# Altium footprint library Connector.PcbLib: 86 footprints (part 2 of 6)
Each footprint in its own frame and in the unit in brackets; x right, y up, seen from the top. Pads: shape width x height; smd on the part's side, far side on the other; paste and mask are expansions set on the pad; w line width, h text height; cw(c..) or ccw(c..) is an arc to the next point about the centre after c.
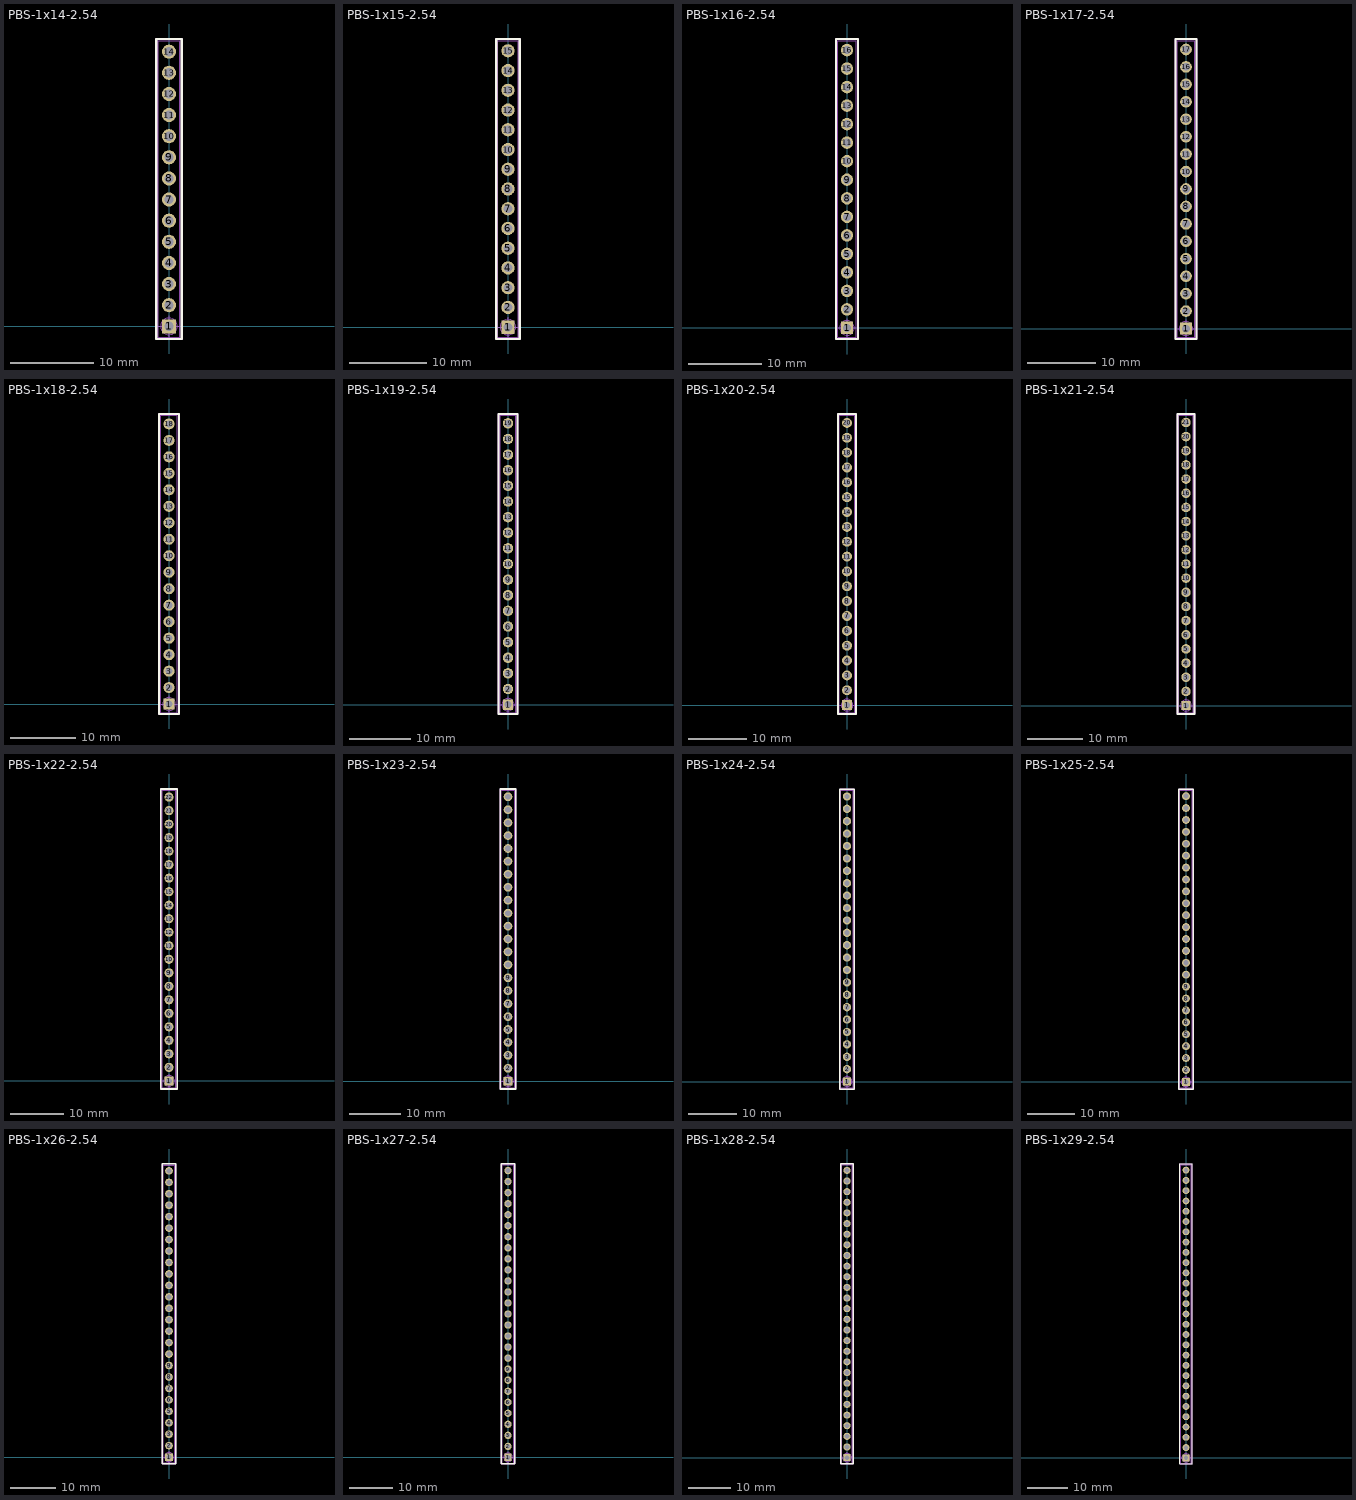
[diagram p1: the footprints below, top view; thin cyan lines are the x and y axes]

## PBS-1x14-2.54 [mm]
pads (14):
  rect 1.7x1.7 hole 1.1: 1(0,0)
  round 1.7 hole 1.1: 2(0,2.54) 3(0,5.08) 4(0,7.62) 5(0,10.16) 6(0,12.7) 7(0,15.24) 8(0,17.78) 9(0,20.32) 10(0,22.86) 11(0,25.4) 12(0,27.94) 13(0,30.48) 14(0,33.02)
Top Overlay:
  lines w0.3: -1.524,-1.524 1.524,-1.524 1.524,34.544 -1.524,34.544 -1.524,-1.524
Bottom Overlay:
  lines w0.3: -1.524,-1.524 1.524,-1.524 1.524,34.544 -1.524,34.544 -1.524,-1.524
Top Assembly:
  lines w0.1: -1.295,-1.295 1.295,-1.295 1.295,34.315 -1.295,34.315 -1.295,-1.295
Top Component Outline:
  lines w0.3: -1.524,-1.524 1.524,-1.524 1.524,34.544 -1.524,34.544 -1.524,-1.524
Top Component Center:
  circle w0.1: c0,0 r1
  lines w0.1: -1.25,0 1.25,0 ; 0,-1.25 0,1.25
3D body "PBS-1x1 2.54.stp": height 8.5, standoff -3.2, extent -1.245,-1.272 1.295,1.268
3D body "PBS-1x1 2.54.stp": height 8.5, standoff -3.2, extent -1.245,1.268 1.295,3.808
3D body "PBS-1x1 2.54.stp": height 8.5, standoff -3.2, extent -1.245,3.808 1.295,6.348
3D body "PBS-1x1 2.54.stp": height 8.5, standoff -3.2, extent -1.245,6.348 1.295,8.888
3D body "PBS-1x1 2.54.stp": height 8.5, standoff -3.2, extent -1.245,8.888 1.295,11.428
3D body "PBS-1x1 2.54.stp": height 8.5, standoff -3.2, extent -1.245,11.428 1.295,13.968
3D body "PBS-1x1 2.54.stp": height 8.5, standoff -3.2, extent -1.245,13.968 1.295,16.508
3D body "PBS-1x1 2.54.stp": height 8.5, standoff -3.2, extent -1.245,16.508 1.295,19.048
3D body "PBS-1x1 2.54.stp": height 8.5, standoff -3.2, extent -1.245,19.048 1.295,21.588
3D body "PBS-1x1 2.54.stp": height 8.5, standoff -3.2, extent -1.245,21.588 1.295,24.128
3D body "PBS-1x1 2.54.stp": height 8.5, standoff -3.2, extent -1.245,24.128 1.295,26.668
3D body "PBS-1x1 2.54.stp": height 8.5, standoff -3.2, extent -1.245,26.668 1.295,29.208
3D body "PBS-1x1 2.54.stp": height 8.5, standoff -3.2, extent -1.245,29.208 1.295,31.748
3D body "PBS-1x1 2.54.stp": height 8.5, standoff -3.2, extent -1.245,31.748 1.295,34.288

## PBS-1x15-2.54 [mm]
pads (15):
  rect 1.7x1.7 hole 1.1: 1(0,0)
  round 1.7 hole 1.1: 2(0,2.54) 3(0,5.08) 4(0,7.62) 5(0,10.16) 6(0,12.7) 7(0,15.24) 8(0,17.78) 9(0,20.32) 10(0,22.86) 11(0,25.4) 12(0,27.94) 13(0,30.48) 14(0,33.02) 15(0,35.56)
Top Overlay:
  lines w0.3: -1.524,-1.524 1.524,-1.524 1.524,37.084 -1.524,37.084 -1.524,-1.524
Bottom Overlay:
  lines w0.3: -1.524,-1.524 1.524,-1.524 1.524,37.084 -1.524,37.084 -1.524,-1.524
Top Assembly:
  lines w0.1: -1.295,-1.295 1.295,-1.295 1.295,36.855 -1.295,36.855 -1.295,-1.295
Top Component Outline:
  lines w0.3: -1.524,-1.524 1.524,-1.524 1.524,37.084 -1.524,37.084 -1.524,-1.524
Top Component Center:
  circle w0.1: c0,0 r1
  lines w0.1: -1.25,0 1.25,0 ; 0,-1.25 0,1.25
3D body "PBS-1x1 2.54.stp": height 8.5, standoff -3.2, extent -1.245,-1.272 1.295,1.268
3D body "PBS-1x1 2.54.stp": height 8.5, standoff -3.2, extent -1.245,1.268 1.295,3.808
3D body "PBS-1x1 2.54.stp": height 8.5, standoff -3.2, extent -1.245,3.808 1.295,6.348
3D body "PBS-1x1 2.54.stp": height 8.5, standoff -3.2, extent -1.245,6.348 1.295,8.888
3D body "PBS-1x1 2.54.stp": height 8.5, standoff -3.2, extent -1.245,8.888 1.295,11.428
3D body "PBS-1x1 2.54.stp": height 8.5, standoff -3.2, extent -1.245,11.428 1.295,13.968
3D body "PBS-1x1 2.54.stp": height 8.5, standoff -3.2, extent -1.245,13.968 1.295,16.508
3D body "PBS-1x1 2.54.stp": height 8.5, standoff -3.2, extent -1.245,16.508 1.295,19.048
3D body "PBS-1x1 2.54.stp": height 8.5, standoff -3.2, extent -1.245,19.048 1.295,21.588
3D body "PBS-1x1 2.54.stp": height 8.5, standoff -3.2, extent -1.245,21.588 1.295,24.128
3D body "PBS-1x1 2.54.stp": height 8.5, standoff -3.2, extent -1.245,24.128 1.295,26.668
3D body "PBS-1x1 2.54.stp": height 8.5, standoff -3.2, extent -1.245,26.668 1.295,29.208
3D body "PBS-1x1 2.54.stp": height 8.5, standoff -3.2, extent -1.245,29.208 1.295,31.748
3D body "PBS-1x1 2.54.stp": height 8.5, standoff -3.2, extent -1.245,31.748 1.295,34.288
3D body "PBS-1x1 2.54.stp": height 8.5, standoff -3.2, extent -1.245,34.288 1.295,36.828

## PBS-1x16-2.54 [mm]
pads (16):
  rect 1.7x1.7 hole 1.1: 1(0,0)
  round 1.7 hole 1.1: 2(0,2.54) 3(0,5.08) 4(0,7.62) 5(0,10.16) 6(0,12.7) 7(0,15.24) 8(0,17.78) 9(0,20.32) 10(0,22.86) 11(0,25.4) 12(0,27.94) 13(0,30.48) 14(0,33.02) 15(0,35.56) 16(0,38.1)
Top Overlay:
  lines w0.3: -1.524,-1.524 -1.524,39.624 1.524,39.624 1.524,-1.524 -1.524,-1.524
Bottom Overlay:
  lines w0.3: -1.524,-1.524 -1.524,39.624 1.524,39.624 1.524,-1.524 -1.524,-1.524
Top Assembly:
  lines w0.1: -1.295,-1.295 1.295,-1.295 1.295,39.395 -1.295,39.395 -1.295,-1.295
Top Component Outline:
  lines w0.3: -1.524,-1.524 -1.524,39.624 1.524,39.624 1.524,-1.524 -1.524,-1.524
Top Component Center:
  circle w0.1: c0,0 r1
  lines w0.1: -1.25,0 1.25,0 ; 0,-1.25 0,1.25
3D body "PBS-1x1 2.54.stp": height 8.5, standoff -3.2, extent -1.245,-1.272 1.295,1.268
3D body "PBS-1x1 2.54.stp": height 8.5, standoff -3.2, extent -1.245,1.268 1.295,3.808
3D body "PBS-1x1 2.54.stp": height 8.5, standoff -3.2, extent -1.245,3.808 1.295,6.348
3D body "PBS-1x1 2.54.stp": height 8.5, standoff -3.2, extent -1.245,6.348 1.295,8.888
3D body "PBS-1x1 2.54.stp": height 8.5, standoff -3.2, extent -1.245,8.888 1.295,11.428
3D body "PBS-1x1 2.54.stp": height 8.5, standoff -3.2, extent -1.245,11.428 1.295,13.968
3D body "PBS-1x1 2.54.stp": height 8.5, standoff -3.2, extent -1.245,13.968 1.295,16.508
3D body "PBS-1x1 2.54.stp": height 8.5, standoff -3.2, extent -1.245,16.508 1.295,19.048
3D body "PBS-1x1 2.54.stp": height 8.5, standoff -3.2, extent -1.245,19.048 1.295,21.588
3D body "PBS-1x1 2.54.stp": height 8.5, standoff -3.2, extent -1.245,21.588 1.295,24.128
3D body "PBS-1x1 2.54.stp": height 8.5, standoff -3.2, extent -1.245,24.128 1.295,26.668
3D body "PBS-1x1 2.54.stp": height 8.5, standoff -3.2, extent -1.245,26.668 1.295,29.208
3D body "PBS-1x1 2.54.stp": height 8.5, standoff -3.2, extent -1.245,29.208 1.295,31.748
3D body "PBS-1x1 2.54.stp": height 8.5, standoff -3.2, extent -1.245,31.748 1.295,34.288
3D body "PBS-1x1 2.54.stp": height 8.5, standoff -3.2, extent -1.245,34.288 1.295,36.828
3D body "PBS-1x1 2.54.stp": height 8.5, standoff -3.2, extent -1.245,36.828 1.295,39.368

## PBS-1x17-2.54 [mm]
pads (17):
  rect 1.7x1.7 hole 1.1: 1(0,0)
  round 1.7 hole 1.1: 2(0,2.54) 3(0,5.08) 4(0,7.62) 5(0,10.16) 6(0,12.7) 7(0,15.24) 8(0,17.78) 9(0,20.32) 10(0,22.86) 11(0,25.4) 12(0,27.94) 13(0,30.48) 14(0,33.02) 15(0,35.56) 16(0,38.1) 17(0,40.64)
Top Overlay:
  lines w0.3: -1.524,-1.524 -1.524,42.164 1.524,42.164 1.524,-1.524 -1.524,-1.524
Bottom Overlay:
  lines w0.3: -1.524,-1.524 -1.524,42.164 1.524,42.164 1.524,-1.524 -1.524,-1.524
Top Assembly:
  lines w0.1: -1.295,-1.295 1.295,-1.295 1.295,41.935 -1.295,41.935 -1.295,-1.295
Top Component Outline:
  lines w0.3: -1.524,-1.524 -1.524,42.164 1.524,42.164 1.524,-1.524 -1.524,-1.524
Top Component Center:
  circle w0.1: c0,0 r1
  lines w0.1: -1.25,0 1.25,0 ; 0,-1.25 0,1.25
3D body "PBS-1x1 2.54.stp": height 8.5, standoff -3.2, extent -1.245,39.368 1.295,41.908
3D body "PBS-1x1 2.54.stp": height 8.5, standoff -3.2, extent -1.245,36.828 1.295,39.368
3D body "PBS-1x1 2.54.stp": height 8.5, standoff -3.2, extent -1.245,34.288 1.295,36.828
3D body "PBS-1x1 2.54.stp": height 8.5, standoff -3.2, extent -1.245,31.748 1.295,34.288
3D body "PBS-1x1 2.54.stp": height 8.5, standoff -3.2, extent -1.245,29.208 1.295,31.748
3D body "PBS-1x1 2.54.stp": height 8.5, standoff -3.2, extent -1.245,26.668 1.295,29.208
3D body "PBS-1x1 2.54.stp": height 8.5, standoff -3.2, extent -1.245,24.128 1.295,26.668
3D body "PBS-1x1 2.54.stp": height 8.5, standoff -3.2, extent -1.245,21.588 1.295,24.128
3D body "PBS-1x1 2.54.stp": height 8.5, standoff -3.2, extent -1.245,19.048 1.295,21.588
3D body "PBS-1x1 2.54.stp": height 8.5, standoff -3.2, extent -1.245,16.508 1.295,19.048
3D body "PBS-1x1 2.54.stp": height 8.5, standoff -3.2, extent -1.245,13.968 1.295,16.508
3D body "PBS-1x1 2.54.stp": height 8.5, standoff -3.2, extent -1.245,11.428 1.295,13.968
3D body "PBS-1x1 2.54.stp": height 8.5, standoff -3.2, extent -1.245,8.888 1.295,11.428
3D body "PBS-1x1 2.54.stp": height 8.5, standoff -3.2, extent -1.245,6.348 1.295,8.888
3D body "PBS-1x1 2.54.stp": height 8.5, standoff -3.2, extent -1.245,3.808 1.295,6.348
3D body "PBS-1x1 2.54.stp": height 8.5, standoff -3.2, extent -1.245,1.268 1.295,3.808
3D body "PBS-1x1 2.54.stp": height 8.5, standoff -3.2, extent -1.245,-1.272 1.295,1.268

## PBS-1x18-2.54 [mm]
pads (18):
  rect 1.7x1.7 hole 1.1: 1(0,0)
  round 1.7 hole 1.1: 2(0,2.54) 3(0,5.08) 4(0,7.62) 5(0,10.16) 6(0,12.7) 7(0,15.24) 8(0,17.78) 9(0,20.32) 10(0,22.86) 11(0,25.4) 12(0,27.94) 13(0,30.48) 14(0,33.02) 15(0,35.56) 16(0,38.1) 17(0,40.64) 18(0,43.18)
Top Overlay:
  lines w0.3: -1.524,-1.524 -1.524,44.704 1.524,44.704 1.524,-1.524 -1.524,-1.524
Bottom Overlay:
  lines w0.3: -1.524,-1.524 -1.524,44.704 1.524,44.704 1.524,-1.524 -1.524,-1.524
Top Assembly:
  lines w0.1: -1.295,-1.295 -1.295,44.475 1.295,44.475 1.295,-1.295 -1.295,-1.295
Top Component Outline:
  lines w0.3: -1.524,-1.524 -1.524,44.704 1.524,44.704 1.524,-1.524 -1.524,-1.524
Top Component Center:
  circle w0.1: c0,0 r1
  lines w0.1: -1.25,0 1.25,0 ; 0,-1.25 0,1.25
3D body "PBS-1x1 2.54.stp": height 8.5, standoff -3.2, extent -1.245,41.908 1.295,44.448
3D body "PBS-1x1 2.54.stp": height 8.5, standoff -3.2, extent -1.245,39.368 1.295,41.908
3D body "PBS-1x1 2.54.stp": height 8.5, standoff -3.2, extent -1.245,36.828 1.295,39.368
3D body "PBS-1x1 2.54.stp": height 8.5, standoff -3.2, extent -1.245,34.288 1.295,36.828
3D body "PBS-1x1 2.54.stp": height 8.5, standoff -3.2, extent -1.245,31.748 1.295,34.288
3D body "PBS-1x1 2.54.stp": height 8.5, standoff -3.2, extent -1.245,29.208 1.295,31.748
3D body "PBS-1x1 2.54.stp": height 8.5, standoff -3.2, extent -1.245,26.668 1.295,29.208
3D body "PBS-1x1 2.54.stp": height 8.5, standoff -3.2, extent -1.245,24.128 1.295,26.668
3D body "PBS-1x1 2.54.stp": height 8.5, standoff -3.2, extent -1.245,21.588 1.295,24.128
3D body "PBS-1x1 2.54.stp": height 8.5, standoff -3.2, extent -1.245,19.048 1.295,21.588
3D body "PBS-1x1 2.54.stp": height 8.5, standoff -3.2, extent -1.245,16.508 1.295,19.048
3D body "PBS-1x1 2.54.stp": height 8.5, standoff -3.2, extent -1.245,13.968 1.295,16.508
3D body "PBS-1x1 2.54.stp": height 8.5, standoff -3.2, extent -1.245,11.428 1.295,13.968
3D body "PBS-1x1 2.54.stp": height 8.5, standoff -3.2, extent -1.245,8.888 1.295,11.428
3D body "PBS-1x1 2.54.stp": height 8.5, standoff -3.2, extent -1.245,6.348 1.295,8.888
3D body "PBS-1x1 2.54.stp": height 8.5, standoff -3.2, extent -1.245,3.808 1.295,6.348
3D body "PBS-1x1 2.54.stp": height 8.5, standoff -3.2, extent -1.245,1.268 1.295,3.808
3D body "PBS-1x1 2.54.stp": height 8.5, standoff -3.2, extent -1.245,-1.272 1.295,1.268

## PBS-1x19-2.54 [mm]
pads (19):
  rect 1.7x1.7 hole 1.1: 1(0,0)
  round 1.7 hole 1.1: 2(0,2.54) 3(0,5.08) 4(0,7.62) 5(0,10.16) 6(0,12.7) 7(0,15.24) 8(0,17.78) 9(0,20.32) 10(0,22.86) 11(0,25.4) 12(0,27.94) 13(0,30.48) 14(0,33.02) 15(0,35.56) 16(0,38.1) 17(0,40.64) 18(0,43.18) 19(0,45.72)
Top Overlay:
  lines w0.3: -1.524,-1.524 1.524,-1.524 1.524,47.244 -1.524,47.244 -1.524,-1.524
Bottom Overlay:
  lines w0.3: -1.524,-1.524 1.524,-1.524 1.524,47.244 -1.524,47.244 -1.524,-1.524
Top Assembly:
  lines w0.1: -1.295,-1.295 1.295,-1.295 1.295,47.015 -1.295,47.015 -1.295,-1.295
Top Component Outline:
  lines w0.3: -1.524,-1.524 1.524,-1.524 1.524,47.244 -1.524,47.244 -1.524,-1.524
Top Component Center:
  circle w0.1: c0,0 r1
  lines w0.1: -1.25,0 1.25,0 ; 0,-1.25 0,1.25
3D body "PBS-1x1 2.54.stp": height 8.5, standoff -3.2, extent -1.245,-1.272 1.295,1.268
3D body "PBS-1x1 2.54.stp": height 8.5, standoff -3.2, extent -1.245,1.268 1.295,3.808
3D body "PBS-1x1 2.54.stp": height 8.5, standoff -3.2, extent -1.245,3.808 1.295,6.348
3D body "PBS-1x1 2.54.stp": height 8.5, standoff -3.2, extent -1.245,6.348 1.295,8.888
3D body "PBS-1x1 2.54.stp": height 8.5, standoff -3.2, extent -1.245,8.888 1.295,11.428
3D body "PBS-1x1 2.54.stp": height 8.5, standoff -3.2, extent -1.245,11.428 1.295,13.968
3D body "PBS-1x1 2.54.stp": height 8.5, standoff -3.2, extent -1.245,13.968 1.295,16.508
3D body "PBS-1x1 2.54.stp": height 8.5, standoff -3.2, extent -1.245,16.508 1.295,19.048
3D body "PBS-1x1 2.54.stp": height 8.5, standoff -3.2, extent -1.245,19.048 1.295,21.588
3D body "PBS-1x1 2.54.stp": height 8.5, standoff -3.2, extent -1.245,21.588 1.295,24.128
3D body "PBS-1x1 2.54.stp": height 8.5, standoff -3.2, extent -1.245,24.128 1.295,26.668
3D body "PBS-1x1 2.54.stp": height 8.5, standoff -3.2, extent -1.245,26.668 1.295,29.208
3D body "PBS-1x1 2.54.stp": height 8.5, standoff -3.2, extent -1.245,29.208 1.295,31.748
3D body "PBS-1x1 2.54.stp": height 8.5, standoff -3.2, extent -1.245,31.748 1.295,34.288
3D body "PBS-1x1 2.54.stp": height 8.5, standoff -3.2, extent -1.245,34.288 1.295,36.828
3D body "PBS-1x1 2.54.stp": height 8.5, standoff -3.2, extent -1.245,36.828 1.295,39.368
3D body "PBS-1x1 2.54.stp": height 8.5, standoff -3.2, extent -1.245,39.368 1.295,41.908
3D body "PBS-1x1 2.54.stp": height 8.5, standoff -3.2, extent -1.245,41.908 1.295,44.448
3D body "PBS-1x1 2.54.stp": height 8.5, standoff -3.2, extent -1.245,44.448 1.295,46.988

## PBS-1x20-2.54 [mm]
pads (20):
  rect 1.7x1.7 hole 1.1: 1(0,0)
  round 1.7 hole 1.1: 2(0,2.54) 3(0,5.08) 4(0,7.62) 5(0,10.16) 6(0,12.7) 7(0,15.24) 8(0,17.78) 9(0,20.32) 10(0,22.86) 11(0,25.4) 12(0,27.94) 13(0,30.48) 14(0,33.02) 15(0,35.56) 16(0,38.1) 17(0,40.64) 18(0,43.18) 19(0,45.72) 20(0,48.26)
Top Overlay:
  lines w0.3: -1.524,-1.524 1.524,-1.524 1.524,49.784 -1.524,49.784 -1.524,-1.524
Bottom Overlay:
  lines w0.3: -1.524,-1.524 1.524,-1.524 1.524,49.784 -1.524,49.784 -1.524,-1.524
Top Assembly:
  lines w0.1: -1.295,-1.295 -1.295,49.555 1.295,49.555 1.295,-1.295 -1.295,-1.295
Top Component Outline:
  lines w0.3: -1.524,-1.524 1.524,-1.524 1.524,49.784 -1.524,49.784 -1.524,-1.524
Top Component Center:
  circle w0.1: c0,0 r1
  lines w0.1: -1.25,0 1.25,0 ; 0,-1.25 0,1.25
3D body "PBS-1x1 2.54.stp": height 8.5, standoff -3.2, extent -1.245,-1.272 1.295,1.268
3D body "PBS-1x1 2.54.stp": height 8.5, standoff -3.2, extent -1.245,1.268 1.295,3.808
3D body "PBS-1x1 2.54.stp": height 8.5, standoff -3.2, extent -1.245,3.808 1.295,6.348
3D body "PBS-1x1 2.54.stp": height 8.5, standoff -3.2, extent -1.245,6.348 1.295,8.888
3D body "PBS-1x1 2.54.stp": height 8.5, standoff -3.2, extent -1.245,8.888 1.295,11.428
3D body "PBS-1x1 2.54.stp": height 8.5, standoff -3.2, extent -1.245,11.428 1.295,13.968
3D body "PBS-1x1 2.54.stp": height 8.5, standoff -3.2, extent -1.245,13.968 1.295,16.508
3D body "PBS-1x1 2.54.stp": height 8.5, standoff -3.2, extent -1.245,16.508 1.295,19.048
3D body "PBS-1x1 2.54.stp": height 8.5, standoff -3.2, extent -1.245,19.048 1.295,21.588
3D body "PBS-1x1 2.54.stp": height 8.5, standoff -3.2, extent -1.245,21.588 1.295,24.128
3D body "PBS-1x1 2.54.stp": height 8.5, standoff -3.2, extent -1.245,24.128 1.295,26.668
3D body "PBS-1x1 2.54.stp": height 8.5, standoff -3.2, extent -1.245,26.668 1.295,29.208
3D body "PBS-1x1 2.54.stp": height 8.5, standoff -3.2, extent -1.245,29.208 1.295,31.748
3D body "PBS-1x1 2.54.stp": height 8.5, standoff -3.2, extent -1.245,31.748 1.295,34.288
3D body "PBS-1x1 2.54.stp": height 8.5, standoff -3.2, extent -1.245,34.288 1.295,36.828
3D body "PBS-1x1 2.54.stp": height 8.5, standoff -3.2, extent -1.245,36.828 1.295,39.368
3D body "PBS-1x1 2.54.stp": height 8.5, standoff -3.2, extent -1.245,39.368 1.295,41.908
3D body "PBS-1x1 2.54.stp": height 8.5, standoff -3.2, extent -1.245,41.908 1.295,44.448
3D body "PBS-1x1 2.54.stp": height 8.5, standoff -3.2, extent -1.245,44.448 1.295,46.988
3D body "PBS-1x1 2.54.stp": height 8.5, standoff -3.2, extent -1.245,46.988 1.295,49.528

## PBS-1x21-2.54 [mm]
pads (21):
  rect 1.7x1.7 hole 1.1: 1(0,0)
  round 1.7 hole 1.1: 2(0,2.54) 3(0,5.08) 4(0,7.62) 5(0,10.16) 6(0,12.7) 7(0,15.24) 8(0,17.78) 9(0,20.32) 10(0,22.86) 11(0,25.4) 12(0,27.94) 13(0,30.48) 14(0,33.02) 15(0,35.56) 16(0,38.1) 17(0,40.64) 18(0,43.18) 19(0,45.72) 20(0,48.26) 21(0,50.8)
Top Overlay:
  lines w0.3: -1.524,-1.524 -1.524,52.324 1.524,52.324 1.524,-1.524 -1.524,-1.524
Bottom Overlay:
  lines w0.3: -1.524,-1.524 -1.524,52.324 1.524,52.324 1.524,-1.524 -1.524,-1.524
Top Assembly:
  lines w0.1: -1.295,-1.295 -1.295,52.095 1.295,52.095 1.295,-1.295 -1.295,-1.295
Top Component Outline:
  lines w0.3: -1.524,-1.524 -1.524,52.324 1.524,52.324 1.524,-1.524 -1.524,-1.524
Top Component Center:
  circle w0.1: c0,0 r1
  lines w0.1: -1.25,0 1.25,0 ; 0,-1.25 0,1.25
3D body "PBS-1x1 2.54.stp": height 8.5, standoff -3.2, extent -1.245,-1.272 1.295,1.268
3D body "PBS-1x1 2.54.stp": height 8.5, standoff -3.2, extent -1.245,1.268 1.295,3.808
3D body "PBS-1x1 2.54.stp": height 8.5, standoff -3.2, extent -1.245,3.808 1.295,6.348
3D body "PBS-1x1 2.54.stp": height 8.5, standoff -3.2, extent -1.245,6.348 1.295,8.888
3D body "PBS-1x1 2.54.stp": height 8.5, standoff -3.2, extent -1.245,8.888 1.295,11.428
3D body "PBS-1x1 2.54.stp": height 8.5, standoff -3.2, extent -1.245,11.428 1.295,13.968
3D body "PBS-1x1 2.54.stp": height 8.5, standoff -3.2, extent -1.245,13.968 1.295,16.508
3D body "PBS-1x1 2.54.stp": height 8.5, standoff -3.2, extent -1.245,16.508 1.295,19.048
3D body "PBS-1x1 2.54.stp": height 8.5, standoff -3.2, extent -1.245,19.048 1.295,21.588
3D body "PBS-1x1 2.54.stp": height 8.5, standoff -3.2, extent -1.245,21.588 1.295,24.128
3D body "PBS-1x1 2.54.stp": height 8.5, standoff -3.2, extent -1.245,24.128 1.295,26.668
3D body "PBS-1x1 2.54.stp": height 8.5, standoff -3.2, extent -1.245,26.668 1.295,29.208
3D body "PBS-1x1 2.54.stp": height 8.5, standoff -3.2, extent -1.245,29.208 1.295,31.748
3D body "PBS-1x1 2.54.stp": height 8.5, standoff -3.2, extent -1.245,31.748 1.295,34.288
3D body "PBS-1x1 2.54.stp": height 8.5, standoff -3.2, extent -1.245,34.288 1.295,36.828
3D body "PBS-1x1 2.54.stp": height 8.5, standoff -3.2, extent -1.245,36.828 1.295,39.368
3D body "PBS-1x1 2.54.stp": height 8.5, standoff -3.2, extent -1.245,39.368 1.295,41.908
3D body "PBS-1x1 2.54.stp": height 8.5, standoff -3.2, extent -1.245,41.908 1.295,44.448
3D body "PBS-1x1 2.54.stp": height 8.5, standoff -3.2, extent -1.245,44.448 1.295,46.988
3D body "PBS-1x1 2.54.stp": height 8.5, standoff -3.2, extent -1.245,46.988 1.295,49.528
3D body "PBS-1x1 2.54.stp": height 8.5, standoff -3.2, extent -1.245,49.528 1.295,52.068

## PBS-1x22-2.54 [mm]
pads (22):
  rect 1.7x1.7 hole 1.1: 1(0,0)
  round 1.7 hole 1.1: 2(0,2.54) 3(0,5.08) 4(0,7.62) 5(0,10.16) 6(0,12.7) 7(0,15.24) 8(0,17.78) 9(0,20.32) 10(0,22.86) 11(0,25.4) 12(0,27.94) 13(0,30.48) 14(0,33.02) 15(0,35.56) 16(0,38.1) 17(0,40.64) 18(0,43.18) 19(0,45.72) 20(0,48.26) 21(0,50.8) 22(0,53.34)
Top Overlay:
  lines w0.3: -1.524,-1.524 1.524,-1.524 1.524,54.864 -1.524,54.864 -1.524,-1.524
Bottom Overlay:
  lines w0.3: -1.524,-1.524 1.524,-1.524 1.524,54.864 -1.524,54.864 -1.524,-1.524
Top Assembly:
  lines w0.1: -1.295,-1.295 -1.295,54.635 1.295,54.635 1.295,-1.295 -1.295,-1.295
Top Component Outline:
  lines w0.3: -1.524,-1.524 1.524,-1.524 1.524,54.864 -1.524,54.864 -1.524,-1.524
Top Component Center:
  circle w0.1: c0,0 r1
  lines w0.1: -1.25,0 1.25,0 ; 0,-1.25 0,1.25
3D body "PBS-1x1 2.54.stp": height 8.5, standoff -3.2, extent -1.245,-1.272 1.295,1.268
3D body "PBS-1x1 2.54.stp": height 8.5, standoff -3.2, extent -1.245,1.268 1.295,3.808
3D body "PBS-1x1 2.54.stp": height 8.5, standoff -3.2, extent -1.245,3.808 1.295,6.348
3D body "PBS-1x1 2.54.stp": height 8.5, standoff -3.2, extent -1.245,6.348 1.295,8.888
3D body "PBS-1x1 2.54.stp": height 8.5, standoff -3.2, extent -1.245,8.888 1.295,11.428
3D body "PBS-1x1 2.54.stp": height 8.5, standoff -3.2, extent -1.245,11.428 1.295,13.968
3D body "PBS-1x1 2.54.stp": height 8.5, standoff -3.2, extent -1.245,13.968 1.295,16.508
3D body "PBS-1x1 2.54.stp": height 8.5, standoff -3.2, extent -1.245,16.508 1.295,19.048
3D body "PBS-1x1 2.54.stp": height 8.5, standoff -3.2, extent -1.245,19.048 1.295,21.588
3D body "PBS-1x1 2.54.stp": height 8.5, standoff -3.2, extent -1.245,21.588 1.295,24.128
3D body "PBS-1x1 2.54.stp": height 8.5, standoff -3.2, extent -1.245,24.128 1.295,26.668
3D body "PBS-1x1 2.54.stp": height 8.5, standoff -3.2, extent -1.245,26.668 1.295,29.208
3D body "PBS-1x1 2.54.stp": height 8.5, standoff -3.2, extent -1.245,29.208 1.295,31.748
3D body "PBS-1x1 2.54.stp": height 8.5, standoff -3.2, extent -1.245,31.748 1.295,34.288
3D body "PBS-1x1 2.54.stp": height 8.5, standoff -3.2, extent -1.245,34.288 1.295,36.828
3D body "PBS-1x1 2.54.stp": height 8.5, standoff -3.2, extent -1.245,36.828 1.295,39.368
3D body "PBS-1x1 2.54.stp": height 8.5, standoff -3.2, extent -1.245,39.368 1.295,41.908
3D body "PBS-1x1 2.54.stp": height 8.5, standoff -3.2, extent -1.245,41.908 1.295,44.448
3D body "PBS-1x1 2.54.stp": height 8.5, standoff -3.2, extent -1.245,44.448 1.295,46.988
3D body "PBS-1x1 2.54.stp": height 8.5, standoff -3.2, extent -1.245,46.988 1.295,49.528
3D body "PBS-1x1 2.54.stp": height 8.5, standoff -3.2, extent -1.245,49.528 1.295,52.068
3D body "PBS-1x1 2.54.stp": height 8.5, standoff -3.2, extent -1.245,52.068 1.295,54.608

## PBS-1x23-2.54 [mm]
pads (23):
  rect 1.7x1.7 hole 1.1: 1(0,0)
  round 1.7 hole 1.1: 2(0,2.54) 3(0,5.08) 4(0,7.62) 5(0,10.16) 6(0,12.7) 7(0,15.24) 8(0,17.78) 9(0,20.32) 10(0,22.86) 11(0,25.4) 12(0,27.94) 13(0,30.48) 14(0,33.02) 15(0,35.56) 16(0,38.1) 17(0,40.64) 18(0,43.18) 19(0,45.72) 20(0,48.26) 21(0,50.8) 22(0,53.34) 23(0,55.88)
Top Overlay:
  lines w0.3: -1.524,-1.524 1.524,-1.524 1.524,57.404 -1.524,57.404 -1.524,-1.524
Bottom Overlay:
  lines w0.3: -1.524,-1.524 1.524,-1.524 1.524,57.404 -1.524,57.404 -1.524,-1.524
Top Assembly:
  lines w0.1: -1.295,-1.295 -1.295,57.175 1.295,57.175 1.295,-1.295 -1.295,-1.295
Top Component Outline:
  lines w0.3: -1.524,-1.524 1.524,-1.524 1.524,57.404 -1.524,57.404 -1.524,-1.524
Top Component Center:
  circle w0.1: c0,0 r1
  lines w0.1: -1.25,0 1.25,0 ; 0,-1.25 0,1.25
3D body "PBS-1x1 2.54.stp": height 8.5, standoff -3.2, extent -1.245,54.608 1.295,57.148
3D body "PBS-1x1 2.54.stp": height 8.5, standoff -3.2, extent -1.245,52.068 1.295,54.608
3D body "PBS-1x1 2.54.stp": height 8.5, standoff -3.2, extent -1.245,49.528 1.295,52.068
3D body "PBS-1x1 2.54.stp": height 8.5, standoff -3.2, extent -1.245,46.988 1.295,49.528
3D body "PBS-1x1 2.54.stp": height 8.5, standoff -3.2, extent -1.245,44.448 1.295,46.988
3D body "PBS-1x1 2.54.stp": height 8.5, standoff -3.2, extent -1.245,41.908 1.295,44.448
3D body "PBS-1x1 2.54.stp": height 8.5, standoff -3.2, extent -1.245,39.368 1.295,41.908
3D body "PBS-1x1 2.54.stp": height 8.5, standoff -3.2, extent -1.245,36.828 1.295,39.368
3D body "PBS-1x1 2.54.stp": height 8.5, standoff -3.2, extent -1.245,34.288 1.295,36.828
3D body "PBS-1x1 2.54.stp": height 8.5, standoff -3.2, extent -1.245,31.748 1.295,34.288
3D body "PBS-1x1 2.54.stp": height 8.5, standoff -3.2, extent -1.245,29.208 1.295,31.748
3D body "PBS-1x1 2.54.stp": height 8.5, standoff -3.2, extent -1.245,26.668 1.295,29.208
3D body "PBS-1x1 2.54.stp": height 8.5, standoff -3.2, extent -1.245,24.128 1.295,26.668
3D body "PBS-1x1 2.54.stp": height 8.5, standoff -3.2, extent -1.245,21.588 1.295,24.128
3D body "PBS-1x1 2.54.stp": height 8.5, standoff -3.2, extent -1.245,19.048 1.295,21.588
3D body "PBS-1x1 2.54.stp": height 8.5, standoff -3.2, extent -1.245,16.508 1.295,19.048
3D body "PBS-1x1 2.54.stp": height 8.5, standoff -3.2, extent -1.245,13.968 1.295,16.508
3D body "PBS-1x1 2.54.stp": height 8.5, standoff -3.2, extent -1.245,11.428 1.295,13.968
3D body "PBS-1x1 2.54.stp": height 8.5, standoff -3.2, extent -1.245,8.888 1.295,11.428
3D body "PBS-1x1 2.54.stp": height 8.5, standoff -3.2, extent -1.245,6.348 1.295,8.888
3D body "PBS-1x1 2.54.stp": height 8.5, standoff -3.2, extent -1.245,3.808 1.295,6.348
3D body "PBS-1x1 2.54.stp": height 8.5, standoff -3.2, extent -1.245,1.268 1.295,3.808
3D body "PBS-1x1 2.54.stp": height 8.5, standoff -3.2, extent -1.245,-1.272 1.295,1.268

## PBS-1x24-2.54 [mm]
pads (24):
  rect 1.7x1.7 hole 1.1: 1(0,0)
  round 1.7 hole 1.1: 2(0,2.54) 3(0,5.08) 4(0,7.62) 5(0,10.16) 6(0,12.7) 7(0,15.24) 8(0,17.78) 9(0,20.32) 10(0,22.86) 11(0,25.4) 12(0,27.94) 13(0,30.48) 14(0,33.02) 15(0,35.56) 16(0,38.1) 17(0,40.64) 18(0,43.18) 19(0,45.72) 20(0,48.26) 21(0,50.8) 22(0,53.34) 23(0,55.88) 24(0,58.42)
Top Overlay:
  lines w0.3: -1.524,-1.524 -1.524,59.944 1.524,59.944 1.524,-1.524 -1.524,-1.524
Bottom Overlay:
  lines w0.3: -1.524,-1.524 -1.524,59.944 1.524,59.944 1.524,-1.524 -1.524,-1.524
Top Assembly:
  lines w0.1: -1.295,-1.295 -1.295,59.715 1.295,59.715 1.295,-1.295 -1.295,-1.295
Top Component Outline:
  lines w0.3: -1.524,-1.524 -1.524,59.944 1.524,59.944 1.524,-1.524 -1.524,-1.524
Top Component Center:
  circle w0.1: c0,0 r1
  lines w0.1: -1.25,0 1.25,0 ; 0,-1.25 0,1.25
3D body "PBS-1x1 2.54.stp": height 8.5, standoff -3.2, extent -1.245,57.148 1.295,59.688
3D body "PBS-1x1 2.54.stp": height 8.5, standoff -3.2, extent -1.245,54.608 1.295,57.148
3D body "PBS-1x1 2.54.stp": height 8.5, standoff -3.2, extent -1.245,52.068 1.295,54.608
3D body "PBS-1x1 2.54.stp": height 8.5, standoff -3.2, extent -1.245,49.528 1.295,52.068
3D body "PBS-1x1 2.54.stp": height 8.5, standoff -3.2, extent -1.245,46.988 1.295,49.528
3D body "PBS-1x1 2.54.stp": height 8.5, standoff -3.2, extent -1.245,44.448 1.295,46.988
3D body "PBS-1x1 2.54.stp": height 8.5, standoff -3.2, extent -1.245,41.908 1.295,44.448
3D body "PBS-1x1 2.54.stp": height 8.5, standoff -3.2, extent -1.245,39.368 1.295,41.908
3D body "PBS-1x1 2.54.stp": height 8.5, standoff -3.2, extent -1.245,36.828 1.295,39.368
3D body "PBS-1x1 2.54.stp": height 8.5, standoff -3.2, extent -1.245,34.288 1.295,36.828
3D body "PBS-1x1 2.54.stp": height 8.5, standoff -3.2, extent -1.245,31.748 1.295,34.288
3D body "PBS-1x1 2.54.stp": height 8.5, standoff -3.2, extent -1.245,29.208 1.295,31.748
3D body "PBS-1x1 2.54.stp": height 8.5, standoff -3.2, extent -1.245,26.668 1.295,29.208
3D body "PBS-1x1 2.54.stp": height 8.5, standoff -3.2, extent -1.245,24.128 1.295,26.668
3D body "PBS-1x1 2.54.stp": height 8.5, standoff -3.2, extent -1.245,21.588 1.295,24.128
3D body "PBS-1x1 2.54.stp": height 8.5, standoff -3.2, extent -1.245,19.048 1.295,21.588
3D body "PBS-1x1 2.54.stp": height 8.5, standoff -3.2, extent -1.245,16.508 1.295,19.048
3D body "PBS-1x1 2.54.stp": height 8.5, standoff -3.2, extent -1.245,13.968 1.295,16.508
3D body "PBS-1x1 2.54.stp": height 8.5, standoff -3.2, extent -1.245,11.428 1.295,13.968
3D body "PBS-1x1 2.54.stp": height 8.5, standoff -3.2, extent -1.245,8.888 1.295,11.428
3D body "PBS-1x1 2.54.stp": height 8.5, standoff -3.2, extent -1.245,6.348 1.295,8.888
3D body "PBS-1x1 2.54.stp": height 8.5, standoff -3.2, extent -1.245,3.808 1.295,6.348
3D body "PBS-1x1 2.54.stp": height 8.5, standoff -3.2, extent -1.245,1.268 1.295,3.808
3D body "PBS-1x1 2.54.stp": height 8.5, standoff -3.2, extent -1.245,-1.272 1.295,1.268

## PBS-1x25-2.54 [mm]
pads (25):
  rect 1.7x1.7 hole 1.1: 1(0,0)
  round 1.7 hole 1.1: 2(0,2.54) 3(0,5.08) 4(0,7.62) 5(0,10.16) 6(0,12.7) 7(0,15.24) 8(0,17.78) 9(0,20.32) 10(0,22.86) 11(0,25.4) 12(0,27.94) 13(0,30.48) 14(0,33.02) 15(0,35.56) 16(0,38.1) 17(0,40.64) 18(0,43.18) 19(0,45.72) 20(0,48.26) 21(0,50.8) 22(0,53.34) 23(0,55.88) 24(0,58.42) 25(0,60.96)
Top Overlay:
  lines w0.3: -1.524,-1.524 1.524,-1.524 1.524,62.484 -1.524,62.484 -1.524,-1.524
Bottom Overlay:
  lines w0.3: -1.524,-1.524 1.524,-1.524 1.524,62.484 -1.524,62.484 -1.524,-1.524
Top Assembly:
  lines w0.1: -1.295,-1.295 -1.295,62.255 1.295,62.255 1.295,-1.295 -1.295,-1.295
Top Component Outline:
  lines w0.3: -1.524,-1.524 1.524,-1.524 1.524,62.484 -1.524,62.484 -1.524,-1.524
Top Component Center:
  circle w0.1: c0,0 r1
  lines w0.1: -1.25,0 1.25,0 ; 0,-1.25 0,1.25
3D body "PBS-1x1 2.54.stp": height 8.5, standoff -3.2, extent -1.245,59.688 1.295,62.228
3D body "PBS-1x1 2.54.stp": height 8.5, standoff -3.2, extent -1.245,57.148 1.295,59.688
3D body "PBS-1x1 2.54.stp": height 8.5, standoff -3.2, extent -1.245,54.608 1.295,57.148
3D body "PBS-1x1 2.54.stp": height 8.5, standoff -3.2, extent -1.245,52.068 1.295,54.608
3D body "PBS-1x1 2.54.stp": height 8.5, standoff -3.2, extent -1.245,49.528 1.295,52.068
3D body "PBS-1x1 2.54.stp": height 8.5, standoff -3.2, extent -1.245,46.988 1.295,49.528
3D body "PBS-1x1 2.54.stp": height 8.5, standoff -3.2, extent -1.245,44.448 1.295,46.988
3D body "PBS-1x1 2.54.stp": height 8.5, standoff -3.2, extent -1.245,41.908 1.295,44.448
3D body "PBS-1x1 2.54.stp": height 8.5, standoff -3.2, extent -1.245,39.368 1.295,41.908
3D body "PBS-1x1 2.54.stp": height 8.5, standoff -3.2, extent -1.245,36.828 1.295,39.368
3D body "PBS-1x1 2.54.stp": height 8.5, standoff -3.2, extent -1.245,34.288 1.295,36.828
3D body "PBS-1x1 2.54.stp": height 8.5, standoff -3.2, extent -1.245,31.748 1.295,34.288
3D body "PBS-1x1 2.54.stp": height 8.5, standoff -3.2, extent -1.245,29.208 1.295,31.748
3D body "PBS-1x1 2.54.stp": height 8.5, standoff -3.2, extent -1.245,26.668 1.295,29.208
3D body "PBS-1x1 2.54.stp": height 8.5, standoff -3.2, extent -1.245,24.128 1.295,26.668
3D body "PBS-1x1 2.54.stp": height 8.5, standoff -3.2, extent -1.245,21.588 1.295,24.128
3D body "PBS-1x1 2.54.stp": height 8.5, standoff -3.2, extent -1.245,19.048 1.295,21.588
3D body "PBS-1x1 2.54.stp": height 8.5, standoff -3.2, extent -1.245,16.508 1.295,19.048
3D body "PBS-1x1 2.54.stp": height 8.5, standoff -3.2, extent -1.245,-1.272 1.295,1.268
3D body "PBS-1x1 2.54.stp": height 8.5, standoff -3.2, extent -1.245,1.268 1.295,3.808
3D body "PBS-1x1 2.54.stp": height 8.5, standoff -3.2, extent -1.245,3.808 1.295,6.348
3D body "PBS-1x1 2.54.stp": height 8.5, standoff -3.2, extent -1.245,6.348 1.295,8.888
3D body "PBS-1x1 2.54.stp": height 8.5, standoff -3.2, extent -1.245,8.888 1.295,11.428
3D body "PBS-1x1 2.54.stp": height 8.5, standoff -3.2, extent -1.245,11.428 1.295,13.968
3D body "PBS-1x1 2.54.stp": height 8.5, standoff -3.2, extent -1.245,13.968 1.295,16.508

## PBS-1x26-2.54 [mm]
pads (26):
  rect 1.7x1.7 hole 1.1: 1(0,0)
  round 1.7 hole 1.1: 2(0,2.54) 3(0,5.08) 4(0,7.62) 5(0,10.16) 6(0,12.7) 7(0,15.24) 8(0,17.78) 9(0,20.32) 10(0,22.86) 11(0,25.4) 12(0,27.94) 13(0,30.48) 14(0,33.02) 15(0,35.56) 16(0,38.1) 17(0,40.64) 18(0,43.18) 19(0,45.72) 20(0,48.26) 21(0,50.8) 22(0,53.34) 23(0,55.88) 24(0,58.42) 25(0,60.96) 26(0,63.5)
Top Overlay:
  lines w0.3: -1.524,-1.524 1.524,-1.524 1.524,65.024 -1.524,65.024 -1.524,-1.524
Bottom Overlay:
  lines w0.3: -1.524,-1.524 1.524,-1.524 1.524,65.024 -1.524,65.024 -1.524,-1.524
Top Assembly:
  lines w0.1: -1.295,-1.295 1.295,-1.295 1.295,64.795 -1.295,64.795 -1.296,-1.295
Top Component Outline:
  lines w0.3: -1.524,-1.524 1.524,-1.524 1.524,65.024 -1.524,65.024 -1.524,-1.524
Top Component Center:
  circle w0.1: c0,0 r1
  lines w0.1: -1.25,0 1.25,0 ; 0,-1.25 0,1.25
3D body "PBS-1x1 2.54.stp": height 8.5, standoff -3.2, extent -1.245,13.968 1.295,16.508
3D body "PBS-1x1 2.54.stp": height 8.5, standoff -3.2, extent -1.245,11.428 1.295,13.968
3D body "PBS-1x1 2.54.stp": height 8.5, standoff -3.2, extent -1.245,8.888 1.295,11.428
3D body "PBS-1x1 2.54.stp": height 8.5, standoff -3.2, extent -1.245,6.348 1.295,8.888
3D body "PBS-1x1 2.54.stp": height 8.5, standoff -3.2, extent -1.245,3.808 1.295,6.348
3D body "PBS-1x1 2.54.stp": height 8.5, standoff -3.2, extent -1.245,1.268 1.295,3.808
3D body "PBS-1x1 2.54.stp": height 8.5, standoff -3.2, extent -1.245,-1.272 1.295,1.268
3D body "PBS-1x1 2.54.stp": height 8.5, standoff -3.2, extent -1.245,16.508 1.295,19.048
3D body "PBS-1x1 2.54.stp": height 8.5, standoff -3.2, extent -1.245,19.048 1.295,21.588
3D body "PBS-1x1 2.54.stp": height 8.5, standoff -3.2, extent -1.245,21.588 1.295,24.128
3D body "PBS-1x1 2.54.stp": height 8.5, standoff -3.2, extent -1.245,24.128 1.295,26.668
3D body "PBS-1x1 2.54.stp": height 8.5, standoff -3.2, extent -1.245,26.668 1.295,29.208
3D body "PBS-1x1 2.54.stp": height 8.5, standoff -3.2, extent -1.245,29.208 1.295,31.748
3D body "PBS-1x1 2.54.stp": height 8.5, standoff -3.2, extent -1.245,31.748 1.295,34.288
3D body "PBS-1x1 2.54.stp": height 8.5, standoff -3.2, extent -1.245,34.288 1.295,36.828
3D body "PBS-1x1 2.54.stp": height 8.5, standoff -3.2, extent -1.245,36.828 1.295,39.368
3D body "PBS-1x1 2.54.stp": height 8.5, standoff -3.2, extent -1.245,39.368 1.295,41.908
3D body "PBS-1x1 2.54.stp": height 8.5, standoff -3.2, extent -1.245,41.908 1.295,44.448
3D body "PBS-1x1 2.54.stp": height 8.5, standoff -3.2, extent -1.245,44.448 1.295,46.988
3D body "PBS-1x1 2.54.stp": height 8.5, standoff -3.2, extent -1.245,46.988 1.295,49.528
3D body "PBS-1x1 2.54.stp": height 8.5, standoff -3.2, extent -1.245,49.528 1.295,52.068
3D body "PBS-1x1 2.54.stp": height 8.5, standoff -3.2, extent -1.245,52.068 1.295,54.608
3D body "PBS-1x1 2.54.stp": height 8.5, standoff -3.2, extent -1.245,54.608 1.295,57.148
3D body "PBS-1x1 2.54.stp": height 8.5, standoff -3.2, extent -1.245,57.148 1.295,59.688
3D body "PBS-1x1 2.54.stp": height 8.5, standoff -3.2, extent -1.245,59.688 1.295,62.228
3D body "PBS-1x1 2.54.stp": height 8.5, standoff -3.2, extent -1.245,62.228 1.295,64.768

## PBS-1x27-2.54 [mm]
pads (27):
  rect 1.7x1.7 hole 1.1: 1(0,0)
  round 1.7 hole 1.1: 2(0,2.54) 3(0,5.08) 4(0,7.62) 5(0,10.16) 6(0,12.7) 7(0,15.24) 8(0,17.78) 9(0,20.32) 10(0,22.86) 11(0,25.4) 12(0,27.94) 13(0,30.48) 14(0,33.02) 15(0,35.56) 16(0,38.1) 17(0,40.64) 18(0,43.18) 19(0,45.72) 20(0,48.26) 21(0,50.8) 22(0,53.34) 23(0,55.88) 24(0,58.42) 25(0,60.96) 26(0,63.5) 27(0,66.04)
Top Overlay:
  lines w0.3: -1.524,-1.524 1.524,-1.524 1.524,67.564 -1.524,67.564 -1.524,-1.524
Bottom Overlay:
  lines w0.3: -1.524,-1.524 1.524,-1.524 1.524,67.564 -1.524,67.564 -1.524,-1.524
Top Assembly:
  lines w0.1: -1.295,-1.295 1.295,-1.295 1.295,67.335 -1.295,67.335 -1.296,-1.295
Top Component Outline:
  lines w0.3: -1.524,-1.524 1.524,-1.524 1.524,67.564 -1.524,67.564 -1.524,-1.524
Top Component Center:
  circle w0.1: c0,0 r1
  lines w0.1: -1.25,0 1.25,0 ; 0,-1.25 0,1.25
3D body "PBS-1x1 2.54.stp": height 8.5, standoff -3.2, extent -1.245,62.228 1.295,64.768
3D body "PBS-1x1 2.54.stp": height 8.5, standoff -3.2, extent -1.245,64.768 1.295,67.308
3D body "PBS-1x1 2.54.stp": height 8.5, standoff -3.2, extent -1.245,59.688 1.295,62.228
3D body "PBS-1x1 2.54.stp": height 8.5, standoff -3.2, extent -1.245,57.148 1.295,59.688
3D body "PBS-1x1 2.54.stp": height 8.5, standoff -3.2, extent -1.245,54.608 1.295,57.148
3D body "PBS-1x1 2.54.stp": height 8.5, standoff -3.2, extent -1.245,52.068 1.295,54.608
3D body "PBS-1x1 2.54.stp": height 8.5, standoff -3.2, extent -1.245,49.528 1.295,52.068
3D body "PBS-1x1 2.54.stp": height 8.5, standoff -3.2, extent -1.245,46.988 1.295,49.528
3D body "PBS-1x1 2.54.stp": height 8.5, standoff -3.2, extent -1.245,44.448 1.295,46.988
3D body "PBS-1x1 2.54.stp": height 8.5, standoff -3.2, extent -1.245,41.908 1.295,44.448
3D body "PBS-1x1 2.54.stp": height 8.5, standoff -3.2, extent -1.245,39.368 1.295,41.908
3D body "PBS-1x1 2.54.stp": height 8.5, standoff -3.2, extent -1.245,36.828 1.295,39.368
3D body "PBS-1x1 2.54.stp": height 8.5, standoff -3.2, extent -1.245,34.288 1.295,36.828
3D body "PBS-1x1 2.54.stp": height 8.5, standoff -3.2, extent -1.245,31.748 1.295,34.288
3D body "PBS-1x1 2.54.stp": height 8.5, standoff -3.2, extent -1.245,29.208 1.295,31.748
3D body "PBS-1x1 2.54.stp": height 8.5, standoff -3.2, extent -1.245,26.668 1.295,29.208
3D body "PBS-1x1 2.54.stp": height 8.5, standoff -3.2, extent -1.245,24.128 1.295,26.668
3D body "PBS-1x1 2.54.stp": height 8.5, standoff -3.2, extent -1.245,21.588 1.295,24.128
3D body "PBS-1x1 2.54.stp": height 8.5, standoff -3.2, extent -1.245,19.048 1.295,21.588
3D body "PBS-1x1 2.54.stp": height 8.5, standoff -3.2, extent -1.245,16.508 1.295,19.048
3D body "PBS-1x1 2.54.stp": height 8.5, standoff -3.2, extent -1.245,-1.272 1.295,1.268
3D body "PBS-1x1 2.54.stp": height 8.5, standoff -3.2, extent -1.245,1.268 1.295,3.808
3D body "PBS-1x1 2.54.stp": height 8.5, standoff -3.2, extent -1.245,3.808 1.295,6.348
3D body "PBS-1x1 2.54.stp": height 8.5, standoff -3.2, extent -1.245,6.348 1.295,8.888
3D body "PBS-1x1 2.54.stp": height 8.5, standoff -3.2, extent -1.245,8.888 1.295,11.428
3D body "PBS-1x1 2.54.stp": height 8.5, standoff -3.2, extent -1.245,11.428 1.295,13.968
3D body "PBS-1x1 2.54.stp": height 8.5, standoff -3.2, extent -1.245,13.968 1.295,16.508

## PBS-1x28-2.54 [mm]
pads (28):
  rect 1.7x1.7 hole 1.1: 1(0,0)
  round 1.7 hole 1.1: 2(0,2.54) 3(0,5.08) 4(0,7.62) 5(0,10.16) 6(0,12.7) 7(0,15.24) 8(0,17.78) 9(0,20.32) 10(0,22.86) 11(0,25.4) 12(0,27.94) 13(0,30.48) 14(0,33.02) 15(0,35.56) 16(0,38.1) 17(0,40.64) 18(0,43.18) 19(0,45.72) 20(0,48.26) 21(0,50.8) 22(0,53.34) 23(0,55.88) 24(0,58.42) 25(0,60.96) 26(0,63.5) 27(0,66.04) 28(0,68.58)
Top Overlay:
  lines w0.3: -1.524,-1.524 1.524,-1.524 1.524,70.104 -1.524,70.104 -1.524,-1.524
Bottom Overlay:
  lines w0.3: -1.524,-1.524 1.524,-1.524 1.524,70.104 -1.524,70.104 -1.524,-1.524
Top Assembly:
  lines w0.1: -1.295,-1.295 1.295,-1.295 1.295,69.875 -1.295,69.875 -1.296,-1.295
Top Component Outline:
  lines w0.3: -1.524,-1.524 1.524,-1.524 1.524,70.104 -1.524,70.104 -1.524,-1.524
Top Component Center:
  circle w0.1: c0,0 r1
  lines w0.1: -1.25,0 1.25,0 ; 0,-1.25 0,1.25
3D body "PBS-1x1 2.54.stp": height 8.5, standoff -3.2, extent -1.245,62.228 1.295,64.768
3D body "PBS-1x1 2.54.stp": height 8.5, standoff -3.2, extent -1.245,64.768 1.295,67.308
3D body "PBS-1x1 2.54.stp": height 8.5, standoff -3.2, extent -1.245,67.308 1.295,69.848
3D body "PBS-1x1 2.54.stp": height 8.5, standoff -3.2, extent -1.245,59.688 1.295,62.228
3D body "PBS-1x1 2.54.stp": height 8.5, standoff -3.2, extent -1.245,57.148 1.295,59.688
3D body "PBS-1x1 2.54.stp": height 8.5, standoff -3.2, extent -1.245,54.608 1.295,57.148
3D body "PBS-1x1 2.54.stp": height 8.5, standoff -3.2, extent -1.245,52.068 1.295,54.608
3D body "PBS-1x1 2.54.stp": height 8.5, standoff -3.2, extent -1.245,49.528 1.295,52.068
3D body "PBS-1x1 2.54.stp": height 8.5, standoff -3.2, extent -1.245,46.988 1.295,49.528
3D body "PBS-1x1 2.54.stp": height 8.5, standoff -3.2, extent -1.245,44.448 1.295,46.988
3D body "PBS-1x1 2.54.stp": height 8.5, standoff -3.2, extent -1.245,41.908 1.295,44.448
3D body "PBS-1x1 2.54.stp": height 8.5, standoff -3.2, extent -1.245,39.368 1.295,41.908
3D body "PBS-1x1 2.54.stp": height 8.5, standoff -3.2, extent -1.245,36.828 1.295,39.368
3D body "PBS-1x1 2.54.stp": height 8.5, standoff -3.2, extent -1.245,34.288 1.295,36.828
3D body "PBS-1x1 2.54.stp": height 8.5, standoff -3.2, extent -1.245,31.748 1.295,34.288
3D body "PBS-1x1 2.54.stp": height 8.5, standoff -3.2, extent -1.245,29.208 1.295,31.748
3D body "PBS-1x1 2.54.stp": height 8.5, standoff -3.2, extent -1.245,26.668 1.295,29.208
3D body "PBS-1x1 2.54.stp": height 8.5, standoff -3.2, extent -1.245,24.128 1.295,26.668
3D body "PBS-1x1 2.54.stp": height 8.5, standoff -3.2, extent -1.245,21.588 1.295,24.128
3D body "PBS-1x1 2.54.stp": height 8.5, standoff -3.2, extent -1.245,19.048 1.295,21.588
3D body "PBS-1x1 2.54.stp": height 8.5, standoff -3.2, extent -1.245,16.508 1.295,19.048
3D body "PBS-1x1 2.54.stp": height 8.5, standoff -3.2, extent -1.245,-1.272 1.295,1.268
3D body "PBS-1x1 2.54.stp": height 8.5, standoff -3.2, extent -1.245,1.268 1.295,3.808
3D body "PBS-1x1 2.54.stp": height 8.5, standoff -3.2, extent -1.245,3.808 1.295,6.348
3D body "PBS-1x1 2.54.stp": height 8.5, standoff -3.2, extent -1.245,6.348 1.295,8.888
3D body "PBS-1x1 2.54.stp": height 8.5, standoff -3.2, extent -1.245,8.888 1.295,11.428
3D body "PBS-1x1 2.54.stp": height 8.5, standoff -3.2, extent -1.245,11.428 1.295,13.968
3D body "PBS-1x1 2.54.stp": height 8.5, standoff -3.2, extent -1.245,13.968 1.295,16.508

## PBS-1x29-2.54 [mm]
pads (29):
  rect 1.7x1.7 hole 1.1: 1(0,0)
  round 1.7 hole 1.1: 2(0,2.54) 3(0,5.08) 4(0,7.62) 5(0,10.16) 6(0,12.7) 7(0,15.24) 8(0,17.78) 9(0,20.32) 10(0,22.86) 11(0,25.4) 12(0,27.94) 13(0,30.48) 14(0,33.02) 15(0,35.56) 16(0,38.1) 17(0,40.64) 18(0,43.18) 19(0,45.72) 20(0,48.26) 21(0,50.8) 22(0,53.34) 23(0,55.88) 24(0,58.42) 25(0,60.96) 26(0,63.5) 27(0,66.04) 28(0,68.58) 29(0,71.12)
Top Overlay:
  lines w0.3: -1.524,-1.524 -1.524,72.644 1.524,72.644 1.524,-1.524 -1.524,-1.524
Bottom Overlay:
  lines w0.3: -1.524,-1.524 -1.524,72.644 1.524,72.644 1.524,-1.524 -1.524,-1.524
Top Assembly:
  lines w0.1: -1.295,-1.295 1.295,-1.295 1.295,72.415 -1.295,72.415 -1.296,-1.295
Top Component Outline:
  lines w0.3: -1.524,-1.524 -1.524,72.644 1.524,72.644 1.524,-1.524 -1.524,-1.524
Top Component Center:
  circle w0.1: c0,0 r1
  lines w0.1: -1.25,0 1.25,0 ; 0,-1.25 0,1.25
3D body "PBS-1x1 2.54.stp": height 8.5, standoff -3.2, extent -1.245,62.228 1.295,64.768
3D body "PBS-1x1 2.54.stp": height 8.5, standoff -3.2, extent -1.245,64.768 1.295,67.308
3D body "PBS-1x1 2.54.stp": height 8.5, standoff -3.2, extent -1.245,67.308 1.295,69.848
3D body "PBS-1x1 2.54.stp": height 8.5, standoff -3.2, extent -1.245,69.848 1.295,72.388
3D body "PBS-1x1 2.54.stp": height 8.5, standoff -3.2, extent -1.245,59.688 1.295,62.228
3D body "PBS-1x1 2.54.stp": height 8.5, standoff -3.2, extent -1.245,57.148 1.295,59.688
3D body "PBS-1x1 2.54.stp": height 8.5, standoff -3.2, extent -1.245,54.608 1.295,57.148
3D body "PBS-1x1 2.54.stp": height 8.5, standoff -3.2, extent -1.245,52.068 1.295,54.608
3D body "PBS-1x1 2.54.stp": height 8.5, standoff -3.2, extent -1.245,49.528 1.295,52.068
3D body "PBS-1x1 2.54.stp": height 8.5, standoff -3.2, extent -1.245,46.988 1.295,49.528
3D body "PBS-1x1 2.54.stp": height 8.5, standoff -3.2, extent -1.245,44.448 1.295,46.988
3D body "PBS-1x1 2.54.stp": height 8.5, standoff -3.2, extent -1.245,41.908 1.295,44.448
3D body "PBS-1x1 2.54.stp": height 8.5, standoff -3.2, extent -1.245,39.368 1.295,41.908
3D body "PBS-1x1 2.54.stp": height 8.5, standoff -3.2, extent -1.245,36.828 1.295,39.368
3D body "PBS-1x1 2.54.stp": height 8.5, standoff -3.2, extent -1.245,34.288 1.295,36.828
3D body "PBS-1x1 2.54.stp": height 8.5, standoff -3.2, extent -1.245,31.748 1.295,34.288
3D body "PBS-1x1 2.54.stp": height 8.5, standoff -3.2, extent -1.245,29.208 1.295,31.748
3D body "PBS-1x1 2.54.stp": height 8.5, standoff -3.2, extent -1.245,26.668 1.295,29.208
3D body "PBS-1x1 2.54.stp": height 8.5, standoff -3.2, extent -1.245,24.128 1.295,26.668
3D body "PBS-1x1 2.54.stp": height 8.5, standoff -3.2, extent -1.245,21.588 1.295,24.128
3D body "PBS-1x1 2.54.stp": height 8.5, standoff -3.2, extent -1.245,19.048 1.295,21.588
3D body "PBS-1x1 2.54.stp": height 8.5, standoff -3.2, extent -1.245,16.508 1.295,19.048
3D body "PBS-1x1 2.54.stp": height 8.5, standoff -3.2, extent -1.245,-1.272 1.295,1.268
3D body "PBS-1x1 2.54.stp": height 8.5, standoff -3.2, extent -1.245,1.268 1.295,3.808
3D body "PBS-1x1 2.54.stp": height 8.5, standoff -3.2, extent -1.245,3.808 1.295,6.348
3D body "PBS-1x1 2.54.stp": height 8.5, standoff -3.2, extent -1.245,6.348 1.295,8.888
3D body "PBS-1x1 2.54.stp": height 8.5, standoff -3.2, extent -1.245,8.888 1.295,11.428
3D body "PBS-1x1 2.54.stp": height 8.5, standoff -3.2, extent -1.245,11.428 1.295,13.968
3D body "PBS-1x1 2.54.stp": height 8.5, standoff -3.2, extent -1.245,13.968 1.295,16.508